# Altium schematic symbol library Electronic Devices_LIB.SchLib: 703 symbols (part 6 of 8) (continued)
## IND_560nH_8.5A_744383560056
designator L?, comment 744383560056
Fixed Ind 560NH 8.5A 8.4MOHM SMD; Manufacturer: Wurth Electronics; Core Material: Metal,Composite; Saturation Current: 10.8A; Shielding: Shielded; DC Resistance (DCR): 8.4mR; Self Resonant Frequency: 85MHz; Test Frequency: 100kHz; Tolerance: 30%; Supplier 1: Digikey; Manufacturer Part Number: 744383560056; RoHS: Yes; Category: Fixed Inductors; Stock 1: 1925; Pricing 1: 1=1.94, 10=1.898, 50=1.815, 100=1.672, 500=1.541 (USD); Mount: Surface Mount; Case/Package: SMD/SMT; Number of Pins: 2; Min Operating Temperature: -40°C; Max Operating Temperature: 125°C; Inductance: 560nH; Series: WE-MAPI; Packaging: Cut Tape; Current Rating: 8.5A; RMS Current (Irms): 8.5A; Inductance Tolerance: 30%; Length: 0.161inch; Width: 0.161inch; Height - Seated (Max): 0.083inch; RoHS Compliant: Yes; Reach SVHC Compliant: Unknown; ComponentLink1URL: http://www.farnell.com/datasheets/2039947.pdf?src-supplier=Element14; ComponentLink1Description: http://www.farnell.com/datasheets/2039947.pdf?src-supplier=Element14; ComponentLink2URL: https://katalog.we-online.de/pbs/datasheet/744383560056.pdf?src-supplier=Digikey; ComponentLink2Description: https://katalog.we-online.de/pbs/datasheet/744383560056.pdf?src-supplier=Digikey; Supplier Part Number 1: 732-8226-1-ND
footprint IND_74438356047 (0.161" L x 0.161" W (4.10mm x 4.10mm))
pins: 1, 2

## IND_680nF_8.1A_744383560068HT
designator L?, comment 744383560068HT
Inductor, 0.68Uh, Shielded, 8.1A Rohs Compliant: Yes |Wurth Elektronik 744383560068HT; Manufacturer: Wurth Electronics; Tolerance: 20%; Saturation Current: 8.5A; DC Resistance (DCR): 9.2mR; Self Resonant Frequency: 67MHz; Inductance: 680nH; Test Frequency: 100kHz; Supplier 1: Digikey; Manufacturer Part Number: 744383560068HT; RoHS: No; Category: Fixed Inductors; Stock 1: 1872; Pricing 1: 1=2.09, 10=1.888, 50=1.736, 100=1.536 (USD); Mount: Surface Mount; Case/Package: Nonstandard; Min Operating Temperature: -55°C; Max Operating Temperature: 150°C; Series: WE-MAPI; Shielding: Shielded; RoHS Compliant: Yes; ComponentLink1URL: https://www.we-online.com/catalog/datasheet/744383560068HT.pdf?src-supplier=Digikey; ComponentLink1Description: https://www.we-online.com/catalog/datasheet/744383560068HT.pdf?src-supplier=Digikey; Supplier Part Number 1: 732-744383560068HTCT-ND
footprint IND_74438356047 (0.161" L x 0.161" W (4.10mm x 4.10mm))
pins: 1, 2

## IND_680nH_23A_MPL-AY1050-R68
designator L?, comment MPL-AY1050-R68  Inductance: 680nH
680 nH Unshielded Molded Inductor 23 A 1.75mOhm 2-SMD, J-Lead; Manufacturer: Monolithic Power Systems; Supplier 1: Digikey; Manufacturer Part Number: MPL-AY1050-R68; RoHS: No; Stock 1: 475; Pricing 1: 1=1.85, 10=1.571, 25=1.448, 50=1.2938, 100=1.0782, 250=1.04736 (USD); ComponentLink1URL: http://datasheet.octopart.com/MPL-AY1050-R68-Monolithic-Power-Systems-datasheet-156109197.pdf?src-supplier=Digikey; ComponentLink1Description: http://datasheet.octopart.com/MPL-AY1050-R68-Monolithic-Power-Systems-datasheet-156109197.pdf?src-supplier=Digikey; ComponentLink2URL: http://datasheet.octopart.com/MPL-AY1050-R68-Monolithic-Power-Systems-datasheet-156109197.pdf?src-supplier=Farnell; ComponentLink2Description: http://datasheet.octopart.com/MPL-AY1050-R68-Monolithic-Power-Systems-datasheet-156109197.pdf?src-supplier=Farnell; ComponentLink3URL: http://datasheet.octopart.com/MPL-AY1050-R68-Monolithic-Power-Systems-datasheet-156109197.pdf?src-supplier=Newark; ComponentLink3Description: http://datasheet.octopart.com/MPL-AY1050-R68-Monolithic-Power-Systems-datasheet-156109197.pdf?src-supplier=Newark; ComponentLink4URL: http://datasheet.octopart.com/MPL-AY1050-R68-Monolithic-Power-Systems-datasheet-156109197.pdf?src-supplier=Mouser; ComponentLink4Description: http://datasheet.octopart.com/MPL-AY1050-R68-Monolithic-Power-Systems-datasheet-156109197.pdf?src-supplier=Mouser; ComponentLink5URL: http://datasheet.octopart.com/MPL-AY1050-R68-Monolithic-Power-Systems-datasheet-156109197.pdf?src-supplier=Avnet; ComponentLink5Description: http://datasheet.octopart.com/MPL-AY1050-R68-Monolithic-Power-Systems-datasheet-156109197.pdf?src-supplier=Avnet; ComponentLink6URL: http://datasheet.octopart.com/MPL-AY1050-R68-Monolithic-Power-Systems-datasheet-156109197.pdf?src-supplier=Symmetry+Electronics; ComponentLink6Description: http://datasheet.octopart.com/MPL-AY1050-R68-Monolithic-Power-Systems-datasheet-156109197.pdf?src-supplier=Symmetry+Electronics; Supplier Part Number 1: 1589-MPL-AY1050-R68CT-ND
pins: 1, 2

## IND_FERRIE_1.6_MAF1608GAD471CT000
designator FB?, comment MAF1608GAD471CT000
Ferrite Beads Noise Suppression Filter 60Ohm 100MHz 1.6A 0.075Ohm DCR 0603 T/R; Manufacturer: TDK; Number of Lines: 1; Supplier 1: Digikey; Manufacturer Part Number: MAF1608GAD471CT000; RoHS: Yes; Category: Ferrite Beads and Chips; Stock 1: 11771; Pricing 1: 1=0.2, 10=0.192, 25=0.1856, 50=0.1792, 100=0.17, 250=0.14216, 500=0.11032, 1000=0.10506 (USD); Mount: Surface Mount; Case/Package: 0603; Case Code (Metric): 1608; Case Code (Imperial): 0603; Min Operating Temperature: -55°C; Max Operating Temperature: 125°C; Packaging: Cut Tape; Max Current Rating: 1.6A; Series: MAF; RoHS Compliant: Yes; ComponentLink1URL: https://product.tdk.com/info/en/catalog/datasheets/suppression-filter_commercial_maf1608g_en.pdf?ref_disty=digikey&src-supplier=Digikey; ComponentLink1Description: https://product.tdk.com/info/en/catalog/datasheets/suppression-filter_commercial_maf1608g_en.pdf?ref_disty=digikey&src-supplier=Digikey; ComponentLink2URL: https://product.tdk.com/info/en/catalog/datasheets/audioline-filter_maf1608g_en.pdf?src-supplier=Digikey; ComponentLink2Description: https://product.tdk.com/info/en/catalog/datasheets/audioline-filter_maf1608g_en.pdf?src-supplier=Digikey; Supplier Part Number 1: 445-174615-1-ND

## IND_FERRITA_1K_450mA_BLM18AG102SN1D
designator FB?, comment BLM18AG102SN1D  Impedance: 1K  Case/Package: 0603
Ferrite Beads Multi-Layer 1KOhm 25% 100MHz 450mA 500mOhm DCR 0603 T/R; Manufacturer: Murata; Material: Steel,Ferrite; Max DC Current: 400mA; DC Resistance (DCR): 500mR; Number of Lines: 1; Shielding: Unshielded; DC Resistance-Max: 700mR; Supplier 1: Digikey; Manufacturer Part Number: BLM18AG102SN1D; RoHS: Yes; Category: Ferrite Beads and Chips; Stock 1: 632067; Pricing 1: 1=0.1, 10=0.074, 25=0.0676, 50=0.0608, 100=0.0445, 250=0.0324, 500=0.02968, 1000=0.02564 (USD); Number of Pins: 2; Core Material: Ferrite; Case Code (Metric): 1608; Case Code (Imperial): 0603; Min Operating Temperature: -55°C; Max Operating Temperature: 125°C; Tolerance: 25%; Package Quantity: 1; Resistance: 500mR; Packaging: Tape and Reel; Current Rating: 400mA; Max Current Rating: 400mA; Termination: SMD/SMT; Test Frequency: 100MHz; DC Current: 400mA; Frequency: 100MHz; Number of Circuits: 1; Series: BLM18A; RMS Current (Irms): 450mA; Series Resistance: 500mR; Length: 1.6mm; Width: 0.8mm; Height: 0.8mm; Depth: 0.8mm; Radiation Hardening: No; Reach SVHC Compliant: No; Military Standard: Not; Lead Free: Lead Free; RoHS Compliant: Yes; ComponentLink1URL: https://datasheet.ciiva.com/1012/l0110s0100blm18a-1012016.pdf?src-supplier=Digikey; ComponentLink1Description: https://datasheet.ciiva.com/1012/l0110s0100blm18a-1012016.pdf?src-supplier=Digikey; ComponentLink2URL: https://datasheet.ciiva.com/5709/1756147-5709056.pdf?src-supplier=Farnell; ComponentLink2Description: https://datasheet.ciiva.com/5709/1756147-5709056.pdf?src-supplier=Farnell; ComponentLink3URL: https://datasheet.ciiva.com/11795/0900766b80032ea2-11795437.pdf?src-supplier=Rs; ComponentLink3Description: https://datasheet.ciiva.com/11795/0900766b80032ea2-11795437.pdf?src-supplier=Rs; ComponentLink4URL: https://datasheet.ciiva.com/29347/442253-da-01-en-chip-drossel-0603-1000r-400ma-1-6x0-8mm-29347887.pdf?src-supplier=Conrad; ComponentLink4Description: https://datasheet.ciiva.com/29347/442253-da-01-en-chip-drossel-0603-1000r-400ma-1-6x0-8mm-29347887.pdf?src-supplier=Conrad; ComponentLink5URL: https://datasheet.ciiva.com/41449/001172220-da-01-en-drossel-0603-1000r-1-6x0-8mm-4000st-41449508.pdf?src-supplier=Conrad; ComponentLink5Description: https://datasheet.ciiva.com/41449/001172220-da-01-en-drossel-0603-1000r-1-6x0-8mm-4000st-41449508.pdf?src-supplier=Conrad; ComponentLink6URL: https://datasheet.ciiva.com/1012/l0110s0100blm18a-1012014.pdf?src-supplier=Digikey; ComponentLink6Description: https://datasheet.ciiva.com/1012/l0110s0100blm18a-1012014.pdf?src-supplier=Digikey; ComponentLink7URL: https://datasheet.ciiva.com/1012/l0110s0100blm18a-1012015.pdf?src-supplier=Digikey; ComponentLink7Description: https://datasheet.ciiva.com/1012/l0110s0100blm18a-1012015.pdf?src-supplier=Digikey; ComponentLink8URL: https://datasheet.ciiva.com/16199/l0110s0100blm18a-16199225.pdf?src-supplier=Future+Electronics; ComponentLink8Description: https://datasheet.ciiva.com/16199/l0110s0100blm18a-16199225.pdf?src-supplier=Future+Electronics; ComponentLink9URL: https://datasheet.ciiva.com/8510/l0110s0100blm18a-8510154.pdf?src-supplier=Avnet; ComponentLink9Description: https://datasheet.ciiva.com/8510/l0110s0100blm18a-8510154.pdf?src-supplier=Avnet; ComponentLink10URL: https://datasheet.ciiva.com/1466/1756147-1466919.pdf?src-supplier=Element14; ComponentLink10Description: https://datasheet.ciiva.com/1466/1756147-1466919.pdf?src-supplier=Element14; ComponentLink11URL: https://datasheet.ciiva.com/1466/1756147-1466920.pdf?src-supplier=Element14; ComponentLink11Description: https://datasheet.ciiva.com/1466/1756147-1466920.pdf?src-supplier=Element14; Supplier Part Number 1: 490-1015-1-ND
footprint IND_0603_INDC1608X08N (Chip Inductor, 2-Leads, Body 1.60x0.80mm, IPC Medium Density)
pins: 1, 2

## IND_FERRITE_BEADS_1K_350mA_BLM15AX102SN1D
designator L?, comment Case/Package: 0402  Impedance: 1K  (hidden comment: *BLM15AX102SN1D)
Ferrite Beads Multi-Layer 1KOhm 25% 100MHz 350mA 490mOhm DCR 0402 Paper T/R; Manufacturer: Murata; Material: Steel,Ferrite; Number of Lines: 1; DC Resistance (DCR): 490mR; Supplier 1: Digikey; Manufacturer Part Number: BLM15AX102SN1D; RoHS: Yes; Category: Ferrite Beads and Chips; Stock 1: 795930; Pricing 1: 1=0.1, 10=0.05, 25=0.0436, 50=0.039, 100=0.0349, 250=0.03008, 500=0.02682, 1000=0.02381, 5000=0.01775, 10000=0.01546, 20000=0.01375 (USD); Number of Pins: 2; Case Code (Metric): 1005; Case Code (Imperial): 0402; Core Material: Ferrite; Min Operating Temperature: -55°C; Max Operating Temperature: 125°C; Package Quantity: 1; Tolerance: 25%; Packaging: Tape and Reel; Current Rating: 350mA; Max Current Rating: 350mA; Termination: SMD/SMT; Max DC Current: 350mA; Test Frequency: 100MHz; Number of Circuits: 1; Series: BLM15AX_SN; DC Resistance-Max: 490mR; RMS Current (Irms): 350mA; Series Resistance: 490mR; Length: 1mm; Width: 0.5mm; Height: 0.5mm; Depth: 0.5mm; Reach SVHC Compliant: No; Lead Free: Lead Free; RoHS Compliant: Yes; ComponentLink1URL: https://datasheet.ciiva.com/1012/l0110e-1012391.pdf?src-supplier=Digikey; ComponentLink1Description: https://datasheet.ciiva.com/1012/l0110e-1012391.pdf?src-supplier=Digikey; ComponentLink2URL: https://datasheet.ciiva.com/1012/l0110e-1012389.pdf?src-supplier=Digikey; ComponentLink2Description: https://datasheet.ciiva.com/1012/l0110e-1012389.pdf?src-supplier=Digikey; ComponentLink3URL: https://datasheet.ciiva.com/1012/l0110e-1012390.pdf?src-supplier=Digikey; ComponentLink3Description: https://datasheet.ciiva.com/1012/l0110e-1012390.pdf?src-supplier=Digikey; ComponentLink4URL: https://datasheet.ciiva.com/16420/l0110s0100blm15ax-sn-16420798.pdf?src-supplier=Future+Electronics; ComponentLink4Description: https://datasheet.ciiva.com/16420/l0110s0100blm15ax-sn-16420798.pdf?src-supplier=Future+Electronics; Supplier Part Number 1: 490-5442-1-ND
footprint IND_0402 (0.039" L x 0.024" W (1.00mm x 0.60mm))
pins: 1, 2

## IND_FERRITE_BEADS_20Ohm_3.2A_MAF1608GAD121LTAH0
designator FB?, comment Impedance: 20R  Case/Package: 0603  (hidden comment: MAF1608GAD121LTAH0)
Ferrite Beads Noise Suppression Filter 20Ohm 100MHz 3.2A 0.027Ohm DCR 0603 T/R; Manufacturer: TDK; Number of Lines: 1; Supplier 1: Digikey; Manufacturer Part Number: MAF1608GAD121LTAH0; RoHS: Yes; Category: Ferrite Beads and Chips; Stock 1: 6163; Pricing 1: 1=0.14, 10=0.132, 25=0.128, 50=0.1236, 100=0.1172, 250=0.098, 500=0.07604, 1000=0.075, 4000=0.075 (USD); Mount: Surface Mount; Min Operating Temperature: -55°C; Max Operating Temperature: 125°C; Series: MAF; RoHS Compliant: Yes; ComponentLink1URL: https://product.tdk.com/info/en/catalog/datasheets/suppression-filter_commercial_maf1608g_en.pdf?ref_disty=digikey&src-supplier=Digikey; ComponentLink1Description: https://product.tdk.com/info/en/catalog/datasheets/suppression-filter_commercial_maf1608g_en.pdf?ref_disty=digikey&src-supplier=Digikey; Supplier Part Number 1: 445-MAF1608GAD121LTAH0CT-ND; Max Current Rating: 3.2A
footprint IND_0603_INDC1608X08N (Chip Inductor, 2-Leads, Body 1.60x0.80mm, IPC Medium Density)
pins: 1, 2

## IND_FERRITE_BEADS_120R_2A_0603_BLM18PG121SH1D
designator L?, comment BLM18PG121SH1D  Impedance: 120R  Case/Package: 0603
Ferrite Beads Multi-Layer 120Ohm 25% 100MHz 2A 50mOhm DCR 0603 Automotive Paper T/R; Manufacturer: Murata; Number of Lines: 1; Shielding: Unshielded; DC Resistance-Max: 50mR; Supplier 1: Digi-Key; Manufacturer Part Number: BLM18PG121SH1D; RoHS: Yes; Category: Ferrite Beads and Chips; Stock 1: 282143; Pricing 1: 1=0.11, 10=0.086, 25=0.0772, 50=0.0566, 100=0.0489, 250=0.03864, 500=0.03262, 1000=0.02747 (USD); Mount: Surface Mount; Case Code (Metric): 1608; Case Code (Imperial): 0603; Weight: 7.1E-05oz; Contact Plating: Tin,Matte; Material: Ferrite; Min Operating Temperature: -55°C; Max Operating Temperature: 125°C; Tolerance: 25%; Packaging: Tape and Reel; Package Quantity: 1; Current Rating: 2A; Max Current Rating: 2A; Termination: SMD/SMT; Max DC Current: 2A; Test Frequency: 100MHz; Number of Circuits: 1; Series: EMIFIL®, BLM18P; Length: 1.6mm; Width: 0.031inch; Height: 0.8mm; Depth: 0.8mm; Ratings: AEC-Q200; Lead Free: Lead Free; RoHS Compliant: Yes; ComponentLink1URL: https://datasheet.octopart.com/BLM18PG121SH1D-Murata-datasheet-141273661.pdf?src-supplier=Element14; ComponentLink1Description: https://datasheet.octopart.com/BLM18PG121SH1D-Murata-datasheet-141273661.pdf?src-supplier=Element14; ComponentLink2URL: https://datasheet.octopart.com/BLM18PG121SH1D-Murata-datasheet-62086335.pdf?src-supplier=Future+Electronics; ComponentLink2Description: https://datasheet.octopart.com/BLM18PG121SH1D-Murata-datasheet-62086335.pdf?src-supplier=Future+Electronics; ComponentLink3URL: http://search.murata.co.jp/Ceramy/image/img/PDF/ENG/L0132S0193BLM18P.pdf?src-supplier=Avnet; ComponentLink3Description: http://search.murata.co.jp/Ceramy/image/img/PDF/ENG/L0132S0193BLM18P.pdf?src-supplier=Avnet; ComponentLink4URL: https://www.murata.com/en-us/products/productdata/8796738650142/ENFA0003.pdf?src-supplier=Digi-Key; ComponentLink4Description: https://www.murata.com/en-us/products/productdata/8796738650142/ENFA0003.pdf?src-supplier=Digi-Key; Supplier Part Number 1: 490-7815-6-ND
footprint IND_0603_INDC1608X08N (Chip Inductor, 2-Leads, Body 1.60x0.80mm, IPC Medium Density)
pins: 1, 2

## IND_FERRITE_BEADS_220R_2.5A_BLM18SG221TN1D
designator FB?, comment Case/Package: 0603  Impedance: 220R  (hidden comment: BLM18SG221TN1D)
Ferrite Beads Multi-Layer 220Ohm 25% 100MHz 2.5A 40mOhm DCR 0603 Paper T/R; Manufacturer: Murata; Material: Steel,Ferrite; Number of Lines: 1; DC Resistance (DCR): 40mR; Supplier 1: Mouser; Manufacturer Part Number: BLM18SG221TN1D; RoHS: Yes; Category: Ferrite Beads and Chips; Stock 1: 399917; Pricing 1: 1=0.14, 10=0.071, 50=0.071, 100=0.049, 1000=0.041, 10000=0.032 (USD); Number of Pins: 2; Core Material: Ferrite; Case Code (Metric): 1608; Case Code (Imperial): 0603; Weight: 7.1E-05oz; Min Operating Temperature: -55°C; Max Operating Temperature: 125°C; Package Quantity: 1; Tolerance: 25%; Packaging: Tape and Reel; Current Rating: 2.5A; Termination: SMD/SMT; Max DC Current: 2.5A; Test Frequency: 100MHz; DC Current: 2.5A; Number of Circuits: 1; Series: BLM18S; DC Resistance-Max: 40mR; RMS Current (Irms): 2.5A; Series Resistance: 40mR; Length: 1.6mm; Width: 0.8mm; Height: 0.8mm; Depth: 0.95mm; Radiation Hardening: No; Reach SVHC Compliant: No; Lead Free: Lead Free; RoHS Compliant: Yes; ComponentLink1URL: https://datasheet.ciiva.com/1561/c31e-1561456.pdf?src-supplier=Newark; ComponentLink1Description: https://datasheet.ciiva.com/1561/c31e-1561456.pdf?src-supplier=Newark; ComponentLink2URL: https://datasheet.ciiva.com/41449/001171724-da-01-en-chip-drossel0603-220r-2500ma-1-6x0-8mm-41449352.pdf?src-supplier=Conrad; ComponentLink2Description: https://datasheet.ciiva.com/41449/001171724-da-01-en-chip-drossel0603-220r-2500ma-1-6x0-8mm-41449352.pdf?src-supplier=Conrad; ComponentLink3URL: https://datasheet.ciiva.com/41449/001172313-da-01-en-drossel-0603-220r-21-6x0-8mm-10000st-41449677.pdf?src-supplier=Conrad; ComponentLink3Description: https://datasheet.ciiva.com/41449/001172313-da-01-en-drossel-0603-220r-21-6x0-8mm-10000st-41449677.pdf?src-supplier=Conrad; ComponentLink4URL: https://datasheet.ciiva.com/1012/l0110s0100blm18s-1012626.pdf?src-supplier=Digikey; ComponentLink4Description: https://datasheet.ciiva.com/1012/l0110s0100blm18s-1012626.pdf?src-supplier=Digikey; ComponentLink5URL: https://datasheet.ciiva.com/1012/l0110s0100blm18s-1012627.pdf?src-supplier=Digikey; ComponentLink5Description: https://datasheet.ciiva.com/1012/l0110s0100blm18s-1012627.pdf?src-supplier=Digikey; ComponentLink6URL: https://datasheet.ciiva.com/1012/l0110s0100blm18s-1012628.pdf?src-supplier=Digikey; ComponentLink6Description: https://datasheet.ciiva.com/1012/l0110s0100blm18s-1012628.pdf?src-supplier=Digikey; ComponentLink7URL: https://datasheet.ciiva.com/8508/l0110s0100blm18s-8508310.pdf?src-supplier=Avnet; ComponentLink7Description: https://datasheet.ciiva.com/8508/l0110s0100blm18s-8508310.pdf?src-supplier=Avnet; ComponentLink8URL: https://datasheet.ciiva.com/8021/5151-8021517.pdf?src-supplier=Element14; ComponentLink8Description: https://datasheet.ciiva.com/8021/5151-8021517.pdf?src-supplier=Element14; ComponentLink9URL: https://datasheet.ciiva.com/8021/5151-8021519.pdf?src-supplier=Element14; ComponentLink9Description: https://datasheet.ciiva.com/8021/5151-8021519.pdf?src-supplier=Element14; ComponentLink10URL: https://datasheet.ciiva.com/14122/blm-series-eng-tds-14122910.pdf?src-supplier=Distrelec; ComponentLink10Description: https://datasheet.ciiva.com/14122/blm-series-eng-tds-14122910.pdf?src-supplier=Distrelec; ComponentLink11URL: https://datasheet.ciiva.com/16204/l0110s0100blm18s-16204029.pdf?src-supplier=Future+Electronics; ComponentLink11Description: https://datasheet.ciiva.com/16204/l0110s0100blm18s-16204029.pdf?src-supplier=Future+Electronics; Supplier Part Number 1: 81-BLM18SG221TN1D; Max Current Rating: 2.5A
footprint IND_0603_INDC1608X08N (Chip Inductor, 2-Leads, Body 1.60x0.80mm, IPC Medium Density)
pins: 1, 2

## IND_FERRITE_BEADS_350mA_0201_BLM03AX241SN1D
designator L?, comment BLM03AX241SN1D  Impedance: 240R  Case/Package: 0201
Ferrite Beads Multi-Layer 240Ohm 25% 100MHz 350mA 380mOhm DCR 0201 Paper T/R; Manufacturer: Murata; Material: Steel; Number of Lines: 1; DC Resistance (DCR): 380mR; Supplier 1: Digi-Key; Manufacturer Part Number: BLM03AX241SN1D; RoHS: Yes; Category: Ferrite Beads and Chips; Stock 1: 129375; Pricing 1: 1=0.1, 10=0.026, 25=0.0232, 50=0.0212, 100=0.0191, 250=0.014, 500=0.01018, 1000=0.00997, 5000=0.00679 (USD); Number of Pins: 2; Case Code (Metric): 0603; Case Code (Imperial): 0201; Min Operating Temperature: -55°C; Max Operating Temperature: 125°C; Package Quantity: 1; Tolerance: 25%; Packaging: Tape and Reel; Current Rating: 350mA; Max Current Rating: 350mA; Max DC Current: 350mA; Termination: SMD/SMT; Test Frequency: 100MHz; Number of Circuits: 1; Series: BLM03AX; Length: 0.024inch; Width: 0.3mm; Height: 0.3mm; RoHS Compliant: Yes; ComponentLink1URL: https://datasheet.ciiva.com/41449/001172129-da-01-en-drossel-0201-240r-30-6x0-3mm-15000st-41449419.pdf?src-supplier=Conrad; ComponentLink1Description: https://datasheet.ciiva.com/41449/001172129-da-01-en-drossel-0201-240r-30-6x0-3mm-15000st-41449419.pdf?src-supplier=Conrad; ComponentLink2URL: https://datasheet.ciiva.com/1012/l0110e-1012684.pdf?src-supplier=Digi-Key; ComponentLink2Description: https://datasheet.ciiva.com/1012/l0110e-1012684.pdf?src-supplier=Digi-Key; ComponentLink3URL: https://datasheet.ciiva.com/1012/l0110e-1012683.pdf?src-supplier=Digi-Key; ComponentLink3Description: https://datasheet.ciiva.com/1012/l0110e-1012683.pdf?src-supplier=Digi-Key; ComponentLink4URL: https://datasheet.ciiva.com/1012/l0110e-1012685.pdf?src-supplier=Digi-Key; ComponentLink4Description: https://datasheet.ciiva.com/1012/l0110e-1012685.pdf?src-supplier=Digi-Key; Supplier Part Number 1: 490-5623-1-ND
footprint IND_0201_FERRITE_BEAD (0.024" L x 0.012" W (0.60mm x 0.30mm))
pins: 1, 2

## IND_FERRITE_BEADS_600Ohm_1.3A_BLM18KG601SN1D
designator L?, comment Impedance: 600R  Case Code (Imperial): 0603  (hidden comment: BLM18KG601SN1D)
Ferrite Beads Multi-Layer 600Ohm 25% 100MHz 1.3A 150mOhm DCR 0603 Paper T/R; Manufacturer: Murata; Material: Steel,Ferrite; DC Resistance (DCR): 150mR; Number of Lines: 1; Number of Circuits: 1NUMBER; Supplier 1: Digikey; Manufacturer Part Number: BLM18KG601SN1D; RoHS: Yes; Category: Ferrite Beads and Chips; Stock 1: 559709; Pricing 1: 1=0.1, 10=0.063, 25=0.0548, 50=0.049, 100=0.0439, 250=0.03776, 500=0.03362, 1000=0.02982, 4000=0.02309, 8000=0.02011, 12000=0.01846, 20000=0.018 (USD); Case/Package: 0603; Number of Pins: 2; Core Material: Ferrite; Case Code (Metric): 1608; Weight: 7.1E-05oz; Min Operating Temperature: -55°C; Max Operating Temperature: 125°C; Tolerance: 25%; Package Quantity: 1; Packaging: Tape and Reel; Current Rating: 1.3A; Max Current Rating: 1.3A; Termination: SMD/SMT; Max DC Current: 1.3A; Test Frequency: 100MHz; DC Current: 1.3A; Series: BLM18K; Inductor Type: FERRITE BEAD; RMS Current (Irms): 1.3A; Series Resistance: 150mR; Length: 1.6mm; Width: 0.8mm; Height: 0.8mm; Depth: 0.8mm; Radiation Hardening: No; Reach SVHC Compliant: No; Military Standard: Not; Lead Free: Lead Free; RoHS Compliant: Yes; ComponentLink1URL: https://datasheet.ciiva.com/11795/0900766b81076276-11795743.pdf?src-supplier=Rs; ComponentLink1Description: https://datasheet.ciiva.com/11795/0900766b81076276-11795743.pdf?src-supplier=Rs; ComponentLink2URL: https://datasheet.ciiva.com/18183/getdatasheetpartid-226848-18183204.pdf?src-supplier=Verical; ComponentLink2Description: https://datasheet.ciiva.com/18183/getdatasheetpartid-226848-18183204.pdf?src-supplier=Verical; ComponentLink3URL: https://datasheet.ciiva.com/1012/l0110e-1012299.pdf?src-supplier=Digikey; ComponentLink3Description: https://datasheet.ciiva.com/1012/l0110e-1012299.pdf?src-supplier=Digikey; ComponentLink4URL: https://datasheet.ciiva.com/1012/l0110e-1012301.pdf?src-supplier=Digikey; ComponentLink4Description: https://datasheet.ciiva.com/1012/l0110e-1012301.pdf?src-supplier=Digikey; ComponentLink5URL: https://datasheet.ciiva.com/1012/l0110e-1012300.pdf?src-supplier=Digikey; ComponentLink5Description: https://datasheet.ciiva.com/1012/l0110e-1012300.pdf?src-supplier=Digikey; ComponentLink6URL: https://datasheet.ciiva.com/7649/486545-7649493.pdf?src-supplier=Element14; ComponentLink6Description: https://datasheet.ciiva.com/7649/486545-7649493.pdf?src-supplier=Element14; ComponentLink7URL: https://datasheet.ciiva.com/22715/486545-22715706.pdf?src-supplier=Element14; ComponentLink7Description: https://datasheet.ciiva.com/22715/486545-22715706.pdf?src-supplier=Element14; Supplier Part Number 1: 490-5258-1-ND
footprint IND_0603_INDC1608X08N (Chip Inductor, 2-Leads, Body 1.60x0.80mm, IPC Medium Density)
pins: 1, 2

## IND_FERRITE_BEADS_600R_2A_BBHV00160808601Y00
designator FB?, comment BBHV00160808601Y00  Impedance: 600R  Case: 0603
Ferrite Chip Bead 600Ohm 2A 0.1Ohm Multilayer 2-Pin 0603 T/R; Manufacturer: Pulse; Supplier 1: Digi-Key; Manufacturer Part Number: BBHV00160808601Y00; RoHS: No; Category: Ferrite Beads and Chips; Stock 1: 8853; Pricing 1: 1=0.1, 10=0.064, 25=0.058, 50=0.052, 100=0.0382, 250=0.02776, 500=0.02546, 1000=0.02199 (USD); Supplier Part Number 1: 553-BBHV00160808601Y00CT-ND; Current rating: 2A
footprint IND_0603_INDC1608X08N (Chip Inductor, 2-Leads, Body 1.60x0.80mm, IPC Medium Density)
pins: 1, 2

## LED_DIO_BICOLOR_LTST-C195KGJRKT
designator D?, comment LTST-C195KGJRKT  (value not drawn)
LED GREEN/RED CLEAR 0606 SMD; Manufacturer: Vishay Lite-On; Color: Green,Red; Lens Color: Colorless; Lens Style: Flat,Diffused,Colorless,Rectangular,Clear; Viewing Angle: 130°; Luminous Intensity: 45mcd; Forward Current: 30mA; Forward Voltage: 2.4V; Dominant Wavelength: 631nm; Test Current: 20mA; Power Rating: 75mW; Wavelength: 639nm; Number of LEDs: 2; Reverse Voltage: 5V; Lens Size: 1.5mm; Supplier 1: Digikey; Manufacturer Part Number: LTST-C195KGJRKT; RoHS: Yes; Category: LEDs; Stock 1: 405899; Pricing 1: 1=0.43, 10=0.283, 100=0.1886, 500=0.13042, 1000=0.10868, 2000=0.09781 (USD); Mount: Surface Mount; Case/Package: 0606; Number of Pins: 2; Case Code (Metric): 1616; Case Code (Imperial): 0606; Min Operating Temperature: -55°C; Max Operating Temperature: 85°C; Packaging: Tape and Reel; Package Quantity: 4000; Illumination Color: Green,Red; Lens Transparency: Clear; Series: -; Number of Elements: 2; Power Dissipation: 75mW; Length: 1.6mm; Width: 1.5mm; Height: 0.55mm; Depth: 1.5mm; Radiation Hardening: No; RoHS Compliant: Yes; Lead Free: Lead Free; ComponentLink1URL: https://datasheet.ciiva.com/11774/0900766b80dc055f-11774310.pdf?src-supplier=Rs; ComponentLink1Description: https://datasheet.ciiva.com/11774/0900766b80dc055f-11774310.pdf?src-supplier=Rs; ComponentLink2URL: https://datasheet.ciiva.com/16287/ltst-c195kgjrkt-16287821.pdf?src-supplier=Future+Electronics; ComponentLink2Description: https://datasheet.ciiva.com/16287/ltst-c195kgjrkt-16287821.pdf?src-supplier=Future+Electronics; ComponentLink3URL: https://datasheet.ciiva.com/2110/ltst-c195kgjrkt-2110796.pdf?src-supplier=Digikey; ComponentLink3Description: https://datasheet.ciiva.com/2110/ltst-c195kgjrkt-2110796.pdf?src-supplier=Digikey; ComponentLink4URL: https://datasheet.ciiva.com/15117/getdatasheetpartid-123527-15117625.pdf?src-supplier=Verical; ComponentLink4Description: https://datasheet.ciiva.com/15117/getdatasheetpartid-123527-15117625.pdf?src-supplier=Verical; ComponentLink5URL: https://datasheet.ciiva.com/2110/p-100-ltst-c195kgjrkt-2110797.pdf?src-supplier=Digikey; ComponentLink5Description: https://datasheet.ciiva.com/2110/p-100-ltst-c195kgjrkt-2110797.pdf?src-supplier=Digikey; ComponentLink6URL: https://datasheet.ciiva.com/2110/p-100-ltst-c195kgjrkt-2110798.pdf?src-supplier=Digikey; ComponentLink6Description: https://datasheet.ciiva.com/2110/p-100-ltst-c195kgjrkt-2110798.pdf?src-supplier=Digikey; Supplier Part Number 1: 160-1452-1-ND
footprint DIO_LED0606_LTST-C195 (Lite-On LED, body 1.60mm L x 1.50mm / 0606 (1616 Metric))
pins: 1 A1, 2 A2, 3 K1, 4 K1

## LED_DIO_BLUE_5mA_0603
designator D?, comment Case Code (Imperial): 0603  Test Current: 5mA  (hidden comment: LTST-C193TBKT-5A)
LED Uni-Color Blue 468nm 2-Pin Chip LED T/R; Manufacturer: Vishay Lite-On; Lens Color: Colorless; Luminous Intensity: 15mcd; Viewing Angle: 130°; Lens Style: Diffused,Colorless,Rectangular,Clear; Dominant Wavelength: 475nm; Lens Transparency: Clear; Number of Elements: 1; Power Dissipation: 76mW; Reverse Voltage: 5V; Forward Current: 20mA; Forward Voltage: 2.8V; Manufacturer Part Number: LTST-C193TBKT-5A; RoHS: Yes; Category: LEDs; Stock 1: 924158; Pricing 1: 1=0.30000, 10=0.23400, 100=0.10510, 500=0.09492, 1000=0.07797, 2000=0.06780 (USD); Mount: Surface Mount; Case/Package: 0603; Number of Pins: 2; Color: Blue; Case Code (Metric): 1608; Min Operating Temperature: -20°C; Max Operating Temperature: 80°C; Packaging: Tape and Reel; Package Quantity: 1; Number of LEDs: 1; Length: 1.6mm; Width: 0.8mm; Height: 0.35mm; Depth: 0.8mm; Radiation Hardening: No; RoHS Compliant: Yes; Lead Free: Lead Free; ComponentLink1URL: https://datasheet.ciiva.com/2111/ltst-c193tbkt-5a-2111219.pdf?src-supplier=Digi-Key; ComponentLink1Description: https://datasheet.ciiva.com/2111/ltst-c193tbkt-5a-2111219.pdf?src-supplier=Digi-Key; ComponentLink2URL: https://datasheet.ciiva.com/4688/lite-on-ltst-c193tbkt-5a-187386-4688832.pdf?src-supplier=Mouser; ComponentLink2Description: https://datasheet.ciiva.com/4688/lite-on-ltst-c193tbkt-5a-187386-4688832.pdf?src-supplier=Mouser; ComponentLink3URL: https://datasheet.ciiva.com/16210/ltst-c193tbkt-5a-16210824.pdf?src-supplier=Future+Electronics; ComponentLink3Description: https://datasheet.ciiva.com/16210/ltst-c193tbkt-5a-16210824.pdf?src-supplier=Future+Electronics; ComponentLink4URL: https://datasheet.ciiva.com/15201/getdatasheetpartid-293056-15201395.pdf?src-supplier=Verical; ComponentLink4Description: https://datasheet.ciiva.com/15201/getdatasheetpartid-293056-15201395.pdf?src-supplier=Verical; ComponentLink5URL: https://datasheet.ciiva.com/11773/0900766b80dc0554-11773880.pdf?src-supplier=Rs; ComponentLink5Description: https://datasheet.ciiva.com/11773/0900766b80dc0554-11773880.pdf?src-supplier=Rs; ComponentLink6URL: https://datasheet.ciiva.com/2111/p-100-ltst-c193tbkt-5a-2111220.pdf?src-supplier=Digi-Key; ComponentLink6Description: https://datasheet.ciiva.com/2111/p-100-ltst-c193tbkt-5a-2111220.pdf?src-supplier=Digi-Key; ComponentLink7URL: https://datasheet.ciiva.com/2111/p-100-ltst-c193tbkt-5a-2111221.pdf?src-supplier=Digi-Key; ComponentLink7Description: https://datasheet.ciiva.com/2111/p-100-ltst-c193tbkt-5a-2111221.pdf?src-supplier=Digi-Key; Supplier 1: Digi-Key; Supplier 2: Arrow Electronics; Supplier 3: Future Electronics; Supplier Part Number 1: 160-1827-1-ND; Supplier Part Number 2: LTST-C193TBKT-5A; Supplier Part Number 3: 1101072; Illumination Color: Blue
footprint LED_0603-BLUE-0.75mm (LED 0603 BLUE height = 0.75mm)
pins: 1 C, 2 A

## LED_DIO_BLUE_20mA_0603_ASCKCB00-NS3T4010302
designator D?, comment ASCKCB00-NS3T4010302  Case/Packcage: 0603  Test Current: 20mA
LED Single Chip Blue 467nm 20mA 2-Pin DFN T/R; Manufacturer: Broadcom; Supplier 1: Digikey; Manufacturer Part Number: ASCKCB00-NS3T4010302; RoHS: No; Category: LEDs; Stock 1: 59526; Pricing 1: 1=0.53, 10=0.327, 100=0.1882, 1000=0.14726, 2000=0.13499 (USD); Supplier Part Number 1: 516-ASCKCB00-NS3T4010302CT-ND
footprint LED_0603-BLUE-0.75mm (LED 0603 BLUE height = 0.75mm)
pins: 1 C, 2 A

## LED_DIO_BLUE_20mA_155124BS73200A
designator D?, comment 155124BS73200A  Test Current: 20mA
WL-SMSW SMT Mono-color Side view Waterclear; Manufacturer: Wurth Electronics; Color: Blue; Lens Color: Colorless; Lens Style: Domed; Lens Transparency: Clear; Luminous Intensity: 120mcd; Viewing Angle: 120°; Dominant Wavelength: 470nm; Lens Size: 1mm; Forward Voltage: 3.2V; Supplier 1: Digikey; Manufacturer Part Number: 155124BS73200A; RoHS: Yes; Category: LEDs; Stock 1: 3290; Pricing 1: 1=0.26, 10=0.25, 100=0.233, 500=0.214, 1000=0.196, 3000=0.169 (USD); Mount: Surface Mount; Case/Package: SMD/SMT; Packaging: Cut Tape; Series: WL-SMSW; Length: 3.2mm; Width: 1.5mm; Height: 1.1mm; RoHS Compliant: Yes; ComponentLink1URL: https://katalog.we-online.de/pbs/datasheet/155124BS73200A.pdf?src-supplier=Digikey; ComponentLink1Description: https://katalog.we-online.de/pbs/datasheet/155124BS73200A.pdf?src-supplier=Digikey; Supplier Part Number 1: 732-12021-1-ND
footprint LED_DIO_155124BS73200A
pins: 1 C, 2 A, 3 MNT

## LED_DIO_DUAL_VSMD66694
designator D?, comment VSMD66694
Dual Color 2 x 2 x 0.87 mm ±60° 660 / 940 nm SMT Emitting Diode; Manufacturer: Vishay Semiconductors; Wavelength: 660nm; Viewing Angle: 120°; Forward Voltage: 2V; Touchscreen: Infrared (IR); Supplier 1: Digikey; Manufacturer Part Number: VSMD66694; RoHS: Yes; Category: LEDs; Stock 1: 6755; Pricing 1: 1=1.48, 10=0.934, 100=0.6913, 500=0.63528, 1000=0.52318 (USD); Mount: Surface Mount; Case/Package: SMD/SMT; Min Operating Temperature: -25°C; Max Operating Temperature: 85°C; Packaging: Cut Tape; Orientation: Top View; Series: -; Lead Free: Lead Free; ComponentLink1URL: http://www.farnell.com/datasheets/2633003.pdf?src-supplier=Farnell; ComponentLink1Description: http://www.farnell.com/datasheets/2633003.pdf?src-supplier=Farnell; ComponentLink2URL: http://www.vishay.com/docs/84324/vsmd66694.pdf?src-supplier=Digikey; ComponentLink2Description: http://www.vishay.com/docs/84324/vsmd66694.pdf?src-supplier=Digikey; Supplier Part Number 1: VSMD66694CT-ND
footprint LED_DIO_DUAL_Vishay_Semiconductor_Opto_Division_6.550-5347.01-4_MFG (2-SMD, No Lead)
pins: 1 IR cathode, 2 RED A, 3 RED C, 4 IR anode

## LED_DIO_GREEN_2mA_APDA3020LZGCK
designator D?, comment APDA3020LZGCK  Test Current: 2mA
LED GREEN CLEAR 2SMD R/A  1500mcd; Manufacturer: Kingbright; Lens Color: Colorless; Luminous Intensity: 600mcd; Viewing Angle: 10°; Dominant Wavelength: 525nm; Forward Voltage: 2.65V; Lens Style: Round,Domed; Lens Size: 1.9mm; Supplier 1: Digikey; Manufacturer Part Number: APDA3020LZGCK; RoHS: Yes; Category: LEDs; Stock 1: 19931; Pricing 1: 1=0.55, 10=0.364, 100=0.241, 1000=0.1861, 2000=0.16817, 6000=0.15695, 10000=0.15135, 50000=0.14294 (USD); Mount: Surface Mount; Case/Package: SMD/SMT; Color: Green; Packaging: Cut Tape; Lens Transparency: Clear; Series: -; Length: 3mm; Width: 2.8mm; Height: 2mm; RoHS Compliant: Yes; ComponentLink1URL: http://www.mouser.com/ds/2/216/APDA3020LZGCK-535649.pdf?src-supplier=Mouser; ComponentLink1Description: http://www.mouser.com/ds/2/216/APDA3020LZGCK-535649.pdf?src-supplier=Mouser; ComponentLink2URL: http://www.kingbrightusa.com/images/catalog/SPEC/APDA3020LZGCK.pdf?src-supplier=Digikey; ComponentLink2Description: http://www.kingbrightusa.com/images/catalog/SPEC/APDA3020LZGCK.pdf?src-supplier=Digikey; Supplier Part Number 1: 754-1929-1-ND
footprint LED_GREEN_APDA3020LZGCK
pins: 1 C, 2 A

## LED_DIO_GREEN_20mA_0603
designator D?, comment LTST-C191KGKT  Test Current: 20mA  Case/Package: 0603
LTST-C191KGKT Lite-On LED, green, 18-71mcd, 130, 1.9V-2.4V SMD, 0603 1.6x0.8x0.55mm RoHS; Manufacturer: Vishay Lite-On; Lens Color: Colorless; Luminous Intensity: 35mcd; Viewing Angle: 130°; Forward Voltage: 2V; Dominant Wavelength: 571nm; Lens Transparency: Clear; Wavelength: 574nm; Lens Style: Flat,Rectangular,Colorless; Number of LEDs: 1; Max Power Dissipation: 75mW; Lens Size: 0.8mm; Supplier 1: Digi-Key; Manufacturer Part Number: LTST-C191KGKT; RoHS: Yes; Stock 1: 1556161; Pricing 1: 1=0.26, 10=0.143, 100=0.0663, 500=0.0612, 1000=0.04794, 2000=0.04693 (USD); Mount: Surface Mount; Number of Pins: 2; Color: Green; Case Code (Metric): 1608; Case Code (Imperial): 0603; Min Operating Temperature: -55°C; Max Operating Temperature: 85°C; Packaging: Tape and Reel; Series: -; Length: 1.6mm; Width: 0.8mm; Height: 0.65mm; RoHS Compliant: Yes; Lead Free: Lead Free; ComponentLink1URL: https://datasheet.ciiva.com/2109/ltst-c191kgkt-2109973.pdf?src-supplier=Digi-Key; ComponentLink1Description: https://datasheet.ciiva.com/2109/ltst-c191kgkt-2109973.pdf?src-supplier=Digi-Key; Supplier Part Number 1: 160-1446-1-ND
footprint LED_0603-GREEN (1.60mm L x 0.80mm W)

## LED_DIO_GREEN_20mA_0603_ASCKCG00-NW5X5020302
designator D?, comment ASCKCG00-NW5X5020302  Case/Package: 0603  Test Current: 20mA
Led Green Clear 0603 SMD; Manufacturer: Broadcom; Supplier 1: Digikey; Manufacturer Part Number: ASCKCG00-NW5X5020302; RoHS: No; Category: LEDs; Stock 1: 56478; Pricing 1: 1=0.53, 10=0.327, 100=0.1882, 1000=0.14726, 2000=0.13499 (USD); Supplier Part Number 1: 516-ASCKCG00-NW5X5020302CT-ND; Parameter 3: *
footprint LED_0603-GREEN (1.60mm L x 0.80mm W)
pins: 1 C, 2 A

## LED_DIO_ORANGE_5mA_0603
designator D?, comment Test Current: 5mA  Case/Package: 0603  (hidden comment: LTST-C193KFKT-5A)
LED Uni-Color Orange 611nm 2-Pin Chip LED T/R; Manufacturer: Vishay Lite-On; Lens Color: Colorless; Power Rating: 75mW; Luminous Intensity: 28.1mcd; Viewing Angle: 130°; Forward Current: 20mA; Forward Voltage: 2.3V; Lens Style: Diffused,Colorless,Rectangular; Illumination Color: Yellow; Dominant Wavelength: 605nm; Lens Transparency: Clear; Number of LEDs: 1; Power Dissipation: 75W; Reverse Voltage: 5V; Supplier 1: Digi-Key; Manufacturer Part Number: LTST-C193KFKT-5A; RoHS: Yes; Category: LEDs; Stock 1: 37829; Pricing 1: 1=0.39, 10=0.211, 100=0.0981, 500=0.0906, 1000=0.07097, 2000=0.06946 (USD); Mount: Surface Mount; Number of Pins: 2; Color: Orange; Case Code (Metric): 1608; Case Code (Imperial): 0603; Min Operating Temperature: -55°C; Max Operating Temperature: 85°C; Packaging: Tape and Reel; Package Quantity: 1; Number of Elements: 1; Length: 1.6mm; Width: 0.8mm; Height: 0.35mm; Depth: 0.8mm; Radiation Hardening: No; RoHS Compliant: Yes; ComponentLink1URL: https://datasheet.ciiva.com/2110/ltst-c193kfkt-5a-2110294.pdf?src-supplier=Digi-Key; ComponentLink1Description: https://datasheet.ciiva.com/2110/ltst-c193kfkt-5a-2110294.pdf?src-supplier=Digi-Key; Supplier Part Number 1: 160-1829-1-ND
footprint LED_0603-ORANGE (LED 0603 ORANGE height = 0.35mm)
pins: 1 C, 2 A
